# Altium schematic symbol library MCU_ST_STM32H7.SchLib: 191 symbols (part 6 of 8) (continued)
## STM32H745ZGTx (continued)
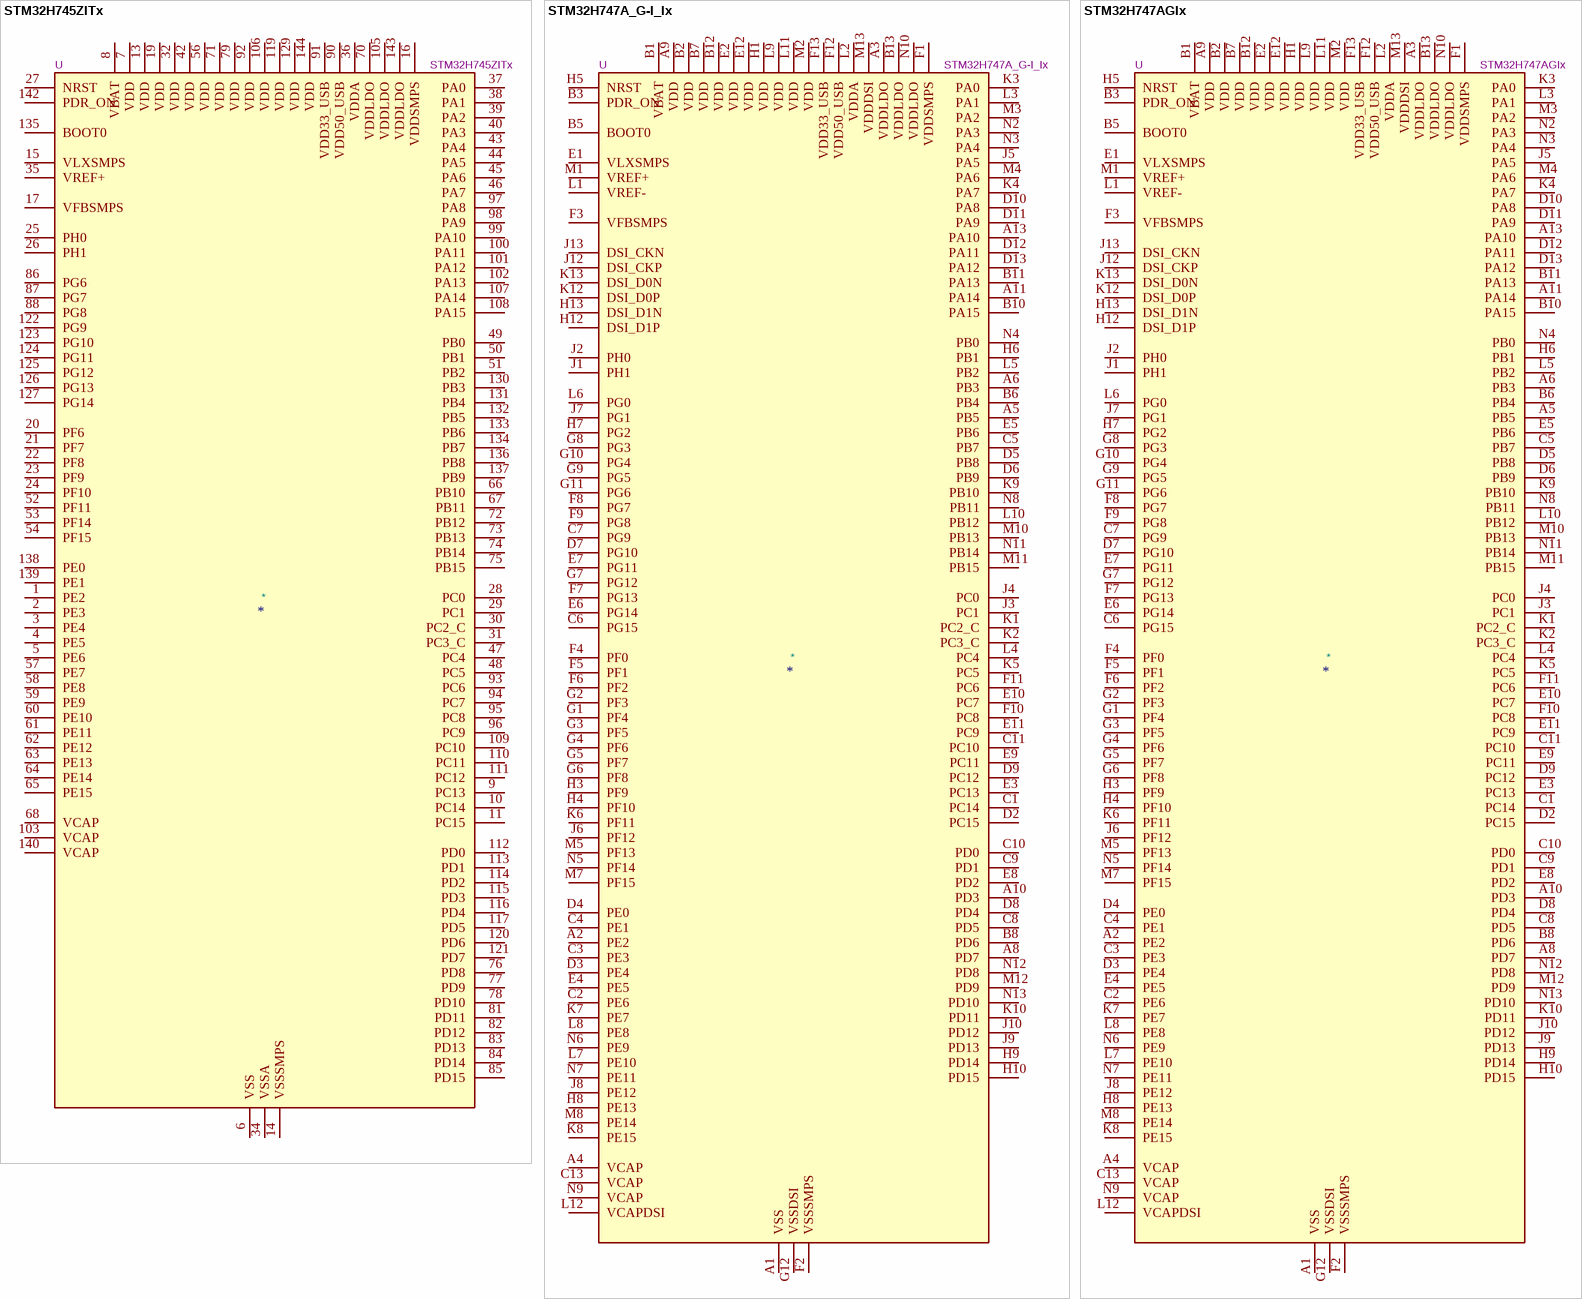
[diagram p53: symbols STM32H745ZITx to STM32H747AGIx]

## STM32H745ZITx
designator *  value STM32H745ZITx  Reference: U
ki_keywords: Arm Cortex-M7 STM32H7 STM32H745/755; ki_description: STMicroelectronics Arm Cortex-M7 MCU, 2048KB flash, 1024KB RAM, 480 MHz, 1.62-3.6V, 99 GPIO, LQFP144; ki_fp_filters: LQFP*20x20mm*P0.5mm*; Footprint: Package_QFP:LQFP-144_20x20mm_P0.5mm; Datasheet: https://www.st.com/resource/en/datasheet/stm32h745zi.pdf
pins: 1 PE2, 2 PE3, 3 PE4, 4 PE5, 5 PE6, 6 VSS, 7 VDD, 8 VBAT, 9 PC13, 10 PC14, 11 PC15, 12 VSS hidden, 13 VDD, 14 VSSSMPS, 15 VLXSMPS, 16 VDDSMPS, 17 VFBSMPS, 18 VSS hidden, 19 VDD, 20 PF6, 21 PF7, 22 PF8, 23 PF9, 24 PF10, 25 PH0, 26 PH1, 27 NRST, 28 PC0, 29 PC1, 30 PC2_C, 31 PC3_C, 32 VDD, 33 VSS hidden, 34 VSSA, 35 VREF+, 36 VDDA, 37 PA0, 38 PA1, 39 PA2, 40 PA3, 41 VSS hidden, 42 VDD, 43 PA4, 44 PA5, 45 PA6, 46 PA7, 47 PC4, 48 PC5, 49 PB0, 50 PB1, 51 PB2, 52 PF11, 53 PF14, 54 PF15, 55 VSS hidden, 56 VDD, 57 PE7, 58 PE8, 59 PE9, 60 PE10, 61 PE11, 62 PE12, 63 PE13, 64 PE14, 65 PE15, 66 PB10, 67 PB11, 68 VCAP, 69 VSS hidden, 70 VDDLDO, 71 VDD, 72 PB12, 73 PB13, 74 PB14, 75 PB15, 76 PD8, 77 PD9, 78 PD10, 79 VDD, 80 VSS hidden, 81 PD11, 82 PD12, 83 PD13, 84 PD14, 85 PD15, 86 PG6, 87 PG7, 88 PG8, 89 VSS hidden, 90 VDD50_USB, 91 VDD33_USB, 92 VDD, 93 PC6, 94 PC7, 95 PC8, 96 PC9, 97 PA8, 98 PA9, 99 PA10, 100 PA11, 101 PA12, 102 PA13, 103 VCAP, 104 VSS hidden, 105 VDDLDO, 106 VDD, 107 PA14, 108 PA15, 109 PC10, 110 PC11, 111 PC12, 112 PD0, 113 PD1, 114 PD2, 115 PD3, 116 PD4, 117 PD5, 118 VSS hidden, 119 VDD, 120 PD6, 121 PD7, 122 PG9, 123 PG10, 124 PG11, 125 PG12, 126 PG13, 127 PG14, 128 VSS hidden, 129 VDD, 130 PB3, 131 PB4, 132 PB5, 133 PB6, 134 PB7, 135 BOOT0, 136 PB8, 137 PB9, 138 PE0, 139 PE1, 140 VCAP, 141 VSS hidden, 142 PDR_ON, 143 VDDLDO, 144 VDD

## STM32H747A_G-I_Ix
designator *  value STM32H747A_G-I_Ix  Reference: U
ki_keywords: Arm Cortex-M7 STM32H7 STM32H747/757; ki_description: STMicroelectronics Arm Cortex-M7 MCU, 1024-2048KB flash, 1024KB RAM, 480 MHz, 1.62-3.6V, 114 GPIO, UFBGA169; ki_fp_filters: *UFBGA*7x7mm*Layout13x13*P0.5mm*; Footprint: Package_BGA:UFBGA-169_7x7mm_Layout13x13_P0.5mm; Datasheet: https://www.st.com/resource/en/datasheet/stm32h747ag.pdf
pins: A1 VSS, A2 PE2, A3 VDDLDO, A4 VCAP, A5 PB5, A6 PB3, A7 VSS hidden, A8 PD7, A9 VDD, A10 PD3, A11 PA14, A12 VSS hidden, A13 PA10, B1 VBAT, B2 VDD, B3 PDR_ON, B4 VSS hidden, B5 BOOT0, B6 PB4, B7 VDD, B8 PD6, B9 VSS hidden, B10 PA15, B11 PA13, B12 VDD, B13 VDDLDO, C1 PC14, C2 PE6, C3 PE3, C4 PE1, C5 PB7, C6 PG15, C7 PG9, C8 PD5, C9 PD1, C10 PD0, C11 PC10, C12 VSS hidden, C13 VCAP, D1 VSS hidden, D2 PC15, D3 PE4, D4 PE0, D5 PB8, D6 PB9, D7 PG10, D8 PD4, D9 PC12, D10 PA8, D11 PA9, D12 PA11, D13 PA12, E1 VLXSMPS, E2 VDD, E3 PC13, E4 PE5, E5 PB6, E6 PG14, E7 PG11, E8 PD2, E9 PC11, E10 PC7, E11 PC9, E12 VDD, E13 VSS hidden, F1 VDDSMPS, F2 VSSSMPS, F3 VFBSMPS, F4 PF0, F5 PF1, F6 PF2, F7 PG13, F8 PG7, F9 PG8, F10 PC8, F11 PC6, F12 VDD50_USB, F13 VDD33_USB, G1 PF4, G2 PF3, G3 PF5, G4 PF6, G5 PF7, G6 PF8, G7 PG12, G8 PG3, G9 PG5, G10 PG4, G11 PG6, G12 VSSDSI, G13 VSSDSI hidden, H1 VDD, H2 VSS hidden, H3 PF9, H4 PF10, H5 NRST, H6 PB1, H7 PG2, H8 PE13, H9 PD14, H10 PD15, H11 VSS hidden, H12 DSI_D1P, H13 DSI_D1N, J1 PH1, J2 PH0, J3 PC1, J4 PC0, J5 PA5, J6 PF12, J7 PG1, J8 PE12, J9 PD13, J10 PD12, J11 VSS hidden, J12 DSI_CKP, J13 DSI_CKN, K1 PC2_C, K2 PC3_C, K3 PA0, K4 PA7, K5 PC5, K6 PF11, K7 PE7, K8 PE15, K9 PB10, K10 PD11, K11 VSS hidden, K12 DSI_D0P, K13 DSI_D0N, L1 VREF-, L2 VDDA, L3 PA1, L4 PC4, L5 PB2, L6 PG0, L7 PE10, L8 PE8, L9 VDD, L10 PB12, L11 VDD, L12 VCAPDSI, L13 VSS hidden, M1 VREF+, M2 VDD, M3 PA2, M4 PA6, M5 PF13, M6 VSS hidden, M7 PF15, M8 PE14, M9 VSS hidden, M10 PB13, M11 PB15, M12 PD9, M13 VDDDSI, N1 VSS hidden, N2 PA3, N3 PA4, N4 PB0, N5 PF14, N6 PE9, N7 PE11, N8 PB11, N9 VCAP, N10 VDDLDO, N11 PB14, N12 PD8, N13 PD10

## STM32H747AGIx
designator *  value STM32H747AGIx  Reference: U
ki_keywords: Arm Cortex-M7 STM32H7 STM32H747/757; ki_description: STMicroelectronics Arm Cortex-M7 MCU, 1024KB flash, 1024KB RAM, 480 MHz, 1.62-3.6V, 114 GPIO, UFBGA169; ki_fp_filters: *UFBGA*7x7mm*Layout13x13*P0.5mm*; Footprint: Package_BGA:UFBGA-169_7x7mm_Layout13x13_P0.5mm; Datasheet: https://www.st.com/resource/en/datasheet/stm32h747ag.pdf
pins: A1 VSS, A2 PE2, A3 VDDLDO, A4 VCAP, A5 PB5, A6 PB3, A7 VSS hidden, A8 PD7, A9 VDD, A10 PD3, A11 PA14, A12 VSS hidden, A13 PA10, B1 VBAT, B2 VDD, B3 PDR_ON, B4 VSS hidden, B5 BOOT0, B6 PB4, B7 VDD, B8 PD6, B9 VSS hidden, B10 PA15, B11 PA13, B12 VDD, B13 VDDLDO, C1 PC14, C2 PE6, C3 PE3, C4 PE1, C5 PB7, C6 PG15, C7 PG9, C8 PD5, C9 PD1, C10 PD0, C11 PC10, C12 VSS hidden, C13 VCAP, D1 VSS hidden, D2 PC15, D3 PE4, D4 PE0, D5 PB8, D6 PB9, D7 PG10, D8 PD4, D9 PC12, D10 PA8, D11 PA9, D12 PA11, D13 PA12, E1 VLXSMPS, E2 VDD, E3 PC13, E4 PE5, E5 PB6, E6 PG14, E7 PG11, E8 PD2, E9 PC11, E10 PC7, E11 PC9, E12 VDD, E13 VSS hidden, F1 VDDSMPS, F2 VSSSMPS, F3 VFBSMPS, F4 PF0, F5 PF1, F6 PF2, F7 PG13, F8 PG7, F9 PG8, F10 PC8, F11 PC6, F12 VDD50_USB, F13 VDD33_USB, G1 PF4, G2 PF3, G3 PF5, G4 PF6, G5 PF7, G6 PF8, G7 PG12, G8 PG3, G9 PG5, G10 PG4, G11 PG6, G12 VSSDSI, G13 VSSDSI hidden, H1 VDD, H2 VSS hidden, H3 PF9, H4 PF10, H5 NRST, H6 PB1, H7 PG2, H8 PE13, H9 PD14, H10 PD15, H11 VSS hidden, H12 DSI_D1P, H13 DSI_D1N, J1 PH1, J2 PH0, J3 PC1, J4 PC0, J5 PA5, J6 PF12, J7 PG1, J8 PE12, J9 PD13, J10 PD12, J11 VSS hidden, J12 DSI_CKP, J13 DSI_CKN, K1 PC2_C, K2 PC3_C, K3 PA0, K4 PA7, K5 PC5, K6 PF11, K7 PE7, K8 PE15, K9 PB10, K10 PD11, K11 VSS hidden, K12 DSI_D0P, K13 DSI_D0N, L1 VREF-, L2 VDDA, L3 PA1, L4 PC4, L5 PB2, L6 PG0, L7 PE10, L8 PE8, L9 VDD, L10 PB12, L11 VDD, L12 VCAPDSI, L13 VSS hidden, M1 VREF+, M2 VDD, M3 PA2, M4 PA6, M5 PF13, M6 VSS hidden, M7 PF15, M8 PE14, M9 VSS hidden, M10 PB13, M11 PB15, M12 PD9, M13 VDDDSI, N1 VSS hidden, N2 PA3, N3 PA4, N4 PB0, N5 PF14, N6 PE9, N7 PE11, N8 PB11, N9 VCAP, N10 VDDLDO, N11 PB14, N12 PD8, N13 PD10

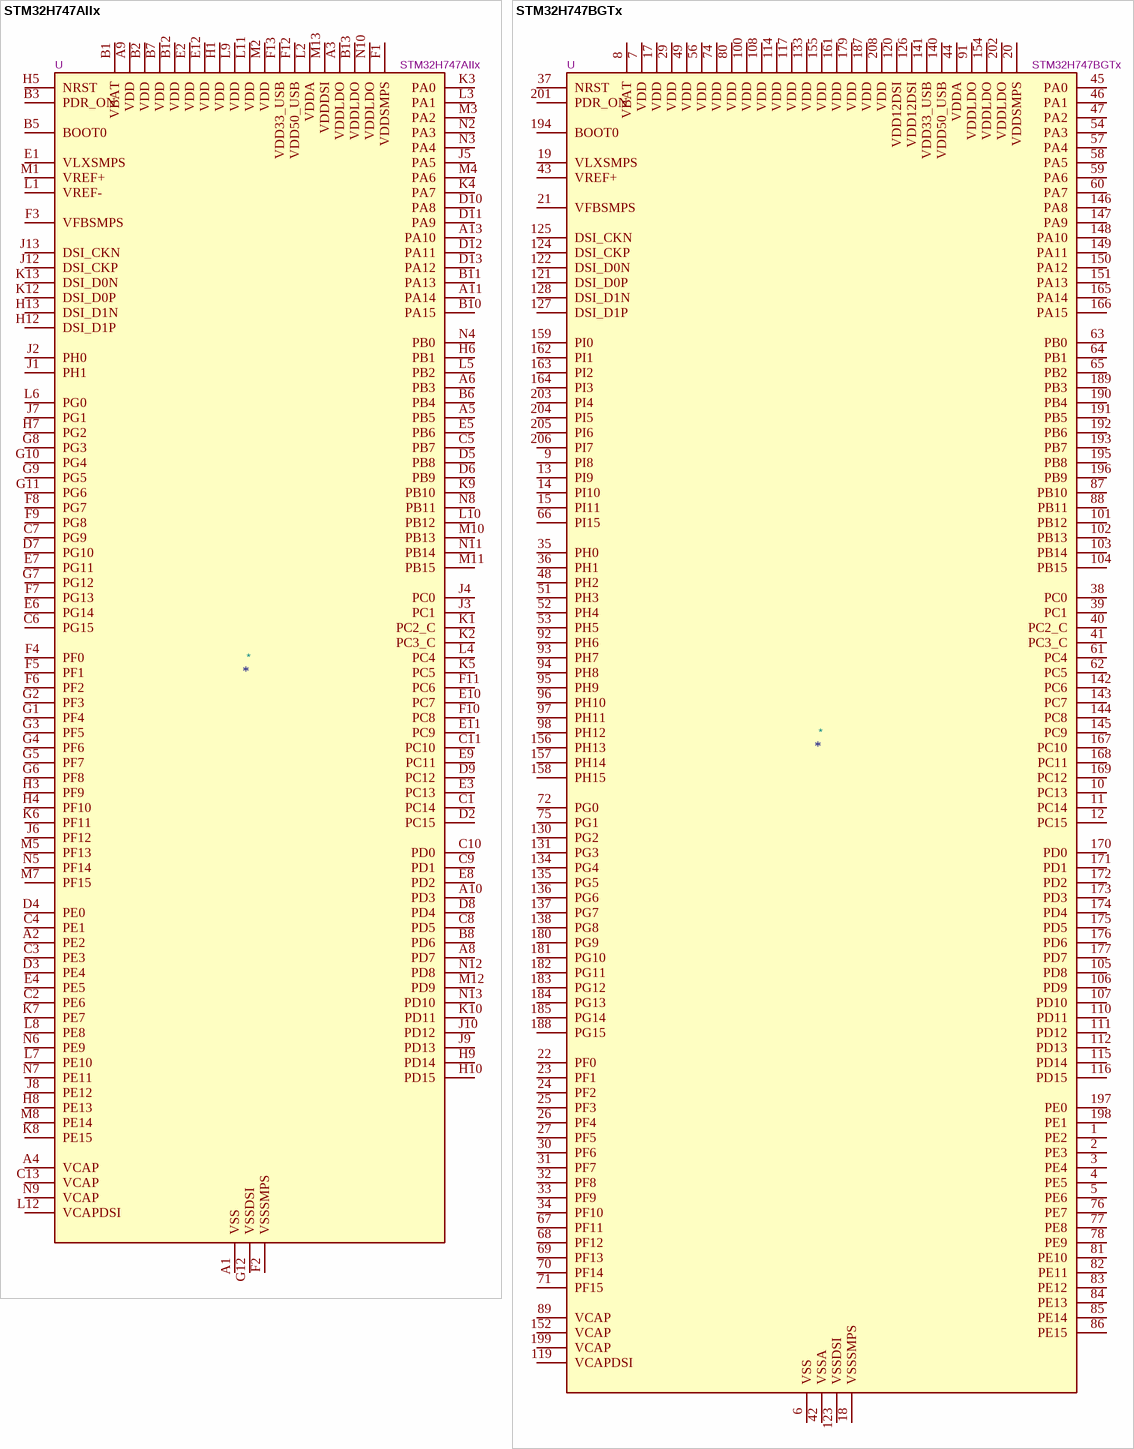
[diagram p54: symbols STM32H747AIIx to STM32H747BGTx]

## STM32H747AIIx
designator *  value STM32H747AIIx  Reference: U
ki_keywords: Arm Cortex-M7 STM32H7 STM32H747/757; ki_description: STMicroelectronics Arm Cortex-M7 MCU, 2048KB flash, 1024KB RAM, 480 MHz, 1.62-3.6V, 114 GPIO, UFBGA169; ki_fp_filters: *UFBGA*7x7mm*Layout13x13*P0.5mm*; Footprint: Package_BGA:UFBGA-169_7x7mm_Layout13x13_P0.5mm; Datasheet: https://www.st.com/resource/en/datasheet/stm32h747ai.pdf
pins: A1 VSS, A2 PE2, A3 VDDLDO, A4 VCAP, A5 PB5, A6 PB3, A7 VSS hidden, A8 PD7, A9 VDD, A10 PD3, A11 PA14, A12 VSS hidden, A13 PA10, B1 VBAT, B2 VDD, B3 PDR_ON, B4 VSS hidden, B5 BOOT0, B6 PB4, B7 VDD, B8 PD6, B9 VSS hidden, B10 PA15, B11 PA13, B12 VDD, B13 VDDLDO, C1 PC14, C2 PE6, C3 PE3, C4 PE1, C5 PB7, C6 PG15, C7 PG9, C8 PD5, C9 PD1, C10 PD0, C11 PC10, C12 VSS hidden, C13 VCAP, D1 VSS hidden, D2 PC15, D3 PE4, D4 PE0, D5 PB8, D6 PB9, D7 PG10, D8 PD4, D9 PC12, D10 PA8, D11 PA9, D12 PA11, D13 PA12, E1 VLXSMPS, E2 VDD, E3 PC13, E4 PE5, E5 PB6, E6 PG14, E7 PG11, E8 PD2, E9 PC11, E10 PC7, E11 PC9, E12 VDD, E13 VSS hidden, F1 VDDSMPS, F2 VSSSMPS, F3 VFBSMPS, F4 PF0, F5 PF1, F6 PF2, F7 PG13, F8 PG7, F9 PG8, F10 PC8, F11 PC6, F12 VDD50_USB, F13 VDD33_USB, G1 PF4, G2 PF3, G3 PF5, G4 PF6, G5 PF7, G6 PF8, G7 PG12, G8 PG3, G9 PG5, G10 PG4, G11 PG6, G12 VSSDSI, G13 VSSDSI hidden, H1 VDD, H2 VSS hidden, H3 PF9, H4 PF10, H5 NRST, H6 PB1, H7 PG2, H8 PE13, H9 PD14, H10 PD15, H11 VSS hidden, H12 DSI_D1P, H13 DSI_D1N, J1 PH1, J2 PH0, J3 PC1, J4 PC0, J5 PA5, J6 PF12, J7 PG1, J8 PE12, J9 PD13, J10 PD12, J11 VSS hidden, J12 DSI_CKP, J13 DSI_CKN, K1 PC2_C, K2 PC3_C, K3 PA0, K4 PA7, K5 PC5, K6 PF11, K7 PE7, K8 PE15, K9 PB10, K10 PD11, K11 VSS hidden, K12 DSI_D0P, K13 DSI_D0N, L1 VREF-, L2 VDDA, L3 PA1, L4 PC4, L5 PB2, L6 PG0, L7 PE10, L8 PE8, L9 VDD, L10 PB12, L11 VDD, L12 VCAPDSI, L13 VSS hidden, M1 VREF+, M2 VDD, M3 PA2, M4 PA6, M5 PF13, M6 VSS hidden, M7 PF15, M8 PE14, M9 VSS hidden, M10 PB13, M11 PB15, M12 PD9, M13 VDDDSI, N1 VSS hidden, N2 PA3, N3 PA4, N4 PB0, N5 PF14, N6 PE9, N7 PE11, N8 PB11, N9 VCAP, N10 VDDLDO, N11 PB14, N12 PD8, N13 PD10

## STM32H747BGTx
designator *  value STM32H747BGTx  Reference: U
ki_keywords: Arm Cortex-M7 STM32H7 STM32H747/757; ki_description: STMicroelectronics Arm Cortex-M7 MCU, 1024KB flash, 1024KB RAM, 480 MHz, 1.62-3.6V, 141 GPIO, LQFP208; ki_fp_filters: LQFP*28x28mm*P0.5mm*; Footprint: Package_QFP:LQFP-208_28x28mm_P0.5mm; Datasheet: https://www.st.com/resource/en/datasheet/stm32h747bg.pdf
pins: 1 PE2, 2 PE3, 3 PE4, 4 PE5, 5 PE6, 6 VSS, 7 VDD, 8 VBAT, 9 PI8, 10 PC13, 11 PC14, 12 PC15, 13 PI9, 14 PI10, 15 PI11, 16 VSS hidden, 17 VDD, 18 VSSSMPS, 19 VLXSMPS, 20 VDDSMPS, 21 VFBSMPS, 22 PF0, 23 PF1, 24 PF2, 25 PF3, 26 PF4, 27 PF5, 28 VSS hidden, 29 VDD, 30 PF6, 31 PF7, 32 PF8, 33 PF9, 34 PF10, 35 PH0, 36 PH1, 37 NRST, 38 PC0, 39 PC1, 40 PC2_C, 41 PC3_C, 42 VSSA, 43 VREF+, 44 VDDA, 45 PA0, 46 PA1, 47 PA2, 48 PH2, 49 VDD, 50 VSS hidden, 51 PH3, 52 PH4, 53 PH5, 54 PA3, 55 VSS hidden, 56 VDD, 57 PA4, 58 PA5, 59 PA6, 60 PA7, 61 PC4, 62 PC5, 63 PB0, 64 PB1, 65 PB2, 66 PI15, 67 PF11, 68 PF12, 69 PF13, 70 PF14, 71 PF15, 72 PG0, 73 VSS hidden, 74 VDD, 75 PG1, 76 PE7, 77 PE8, 78 PE9, 79 VSS hidden, 80 VDD, 81 PE10, 82 PE11, 83 PE12, 84 PE13, 85 PE14, 86 PE15, 87 PB10, 88 PB11, 89 VCAP, 90 VSS hidden, 91 VDDLDO, 92 PH6, 93 PH7, 94 PH8, 95 PH9, 96 PH10, 97 PH11, 98 PH12, 99 VSS hidden, 100 VDD, 101 PB12, 102 PB13, 103 PB14, 104 PB15, 105 PD8, 106 PD9, 107 PD10, 108 VDD, 109 VSS hidden, 110 PD11, 111 PD12, 112 PD13, 113 VSS hidden, 114 VDD, 115 PD14, 116 PD15, 117 VDD, 118 VSS hidden, 119 VCAPDSI, 120 VDD12DSI, 121 DSI_D0P, 122 DSI_D0N, 123 VSSDSI, 124 DSI_CKP, 125 DSI_CKN, 126 VDD12DSI, 127 DSI_D1P, 128 DSI_D1N, 129 VSSDSI hidden, 130 PG2, 131 PG3, 132 VSS hidden, 133 VDD, 134 PG4, 135 PG5, 136 PG6, 137 PG7, 138 PG8, 139 VSS hidden, 140 VDD50_USB, 141 VDD33_USB, 142 PC6, 143 PC7, 144 PC8, 145 PC9, 146 PA8, 147 PA9, 148 PA10, 149 PA11, 150 PA12, 151 PA13, 152 VCAP, 153 VSS hidden, 154 VDDLDO, 155 VDD, 156 PH13, 157 PH14, 158 PH15, 159 PI0, 160 VSS hidden, 161 VDD, 162 PI1, 163 PI2, 164 PI3, 165 PA14, 166 PA15, 167 PC10, 168 PC11, 169 PC12, 170 PD0, 171 PD1, 172 PD2, 173 PD3, 174 PD4, 175 PD5, 176 PD6, 177 PD7, 178 VSS hidden, 179 VDD, 180 PG9, 181 PG10, 182 PG11, 183 PG12, 184 PG13, 185 PG14, 186 VSS hidden, 187 VDD, 188 PG15, 189 PB3, 190 PB4, 191 PB5, 192 PB6, 193 PB7, 194 BOOT0, 195 PB8, 196 PB9, 197 PE0, 198 PE1, 199 VCAP, 200 VSS hidden, 201 PDR_ON, 202 VDDLDO, 203 PI4, 204 PI5, 205 PI6, 206 PI7, 207 VSS hidden, 208 VDD

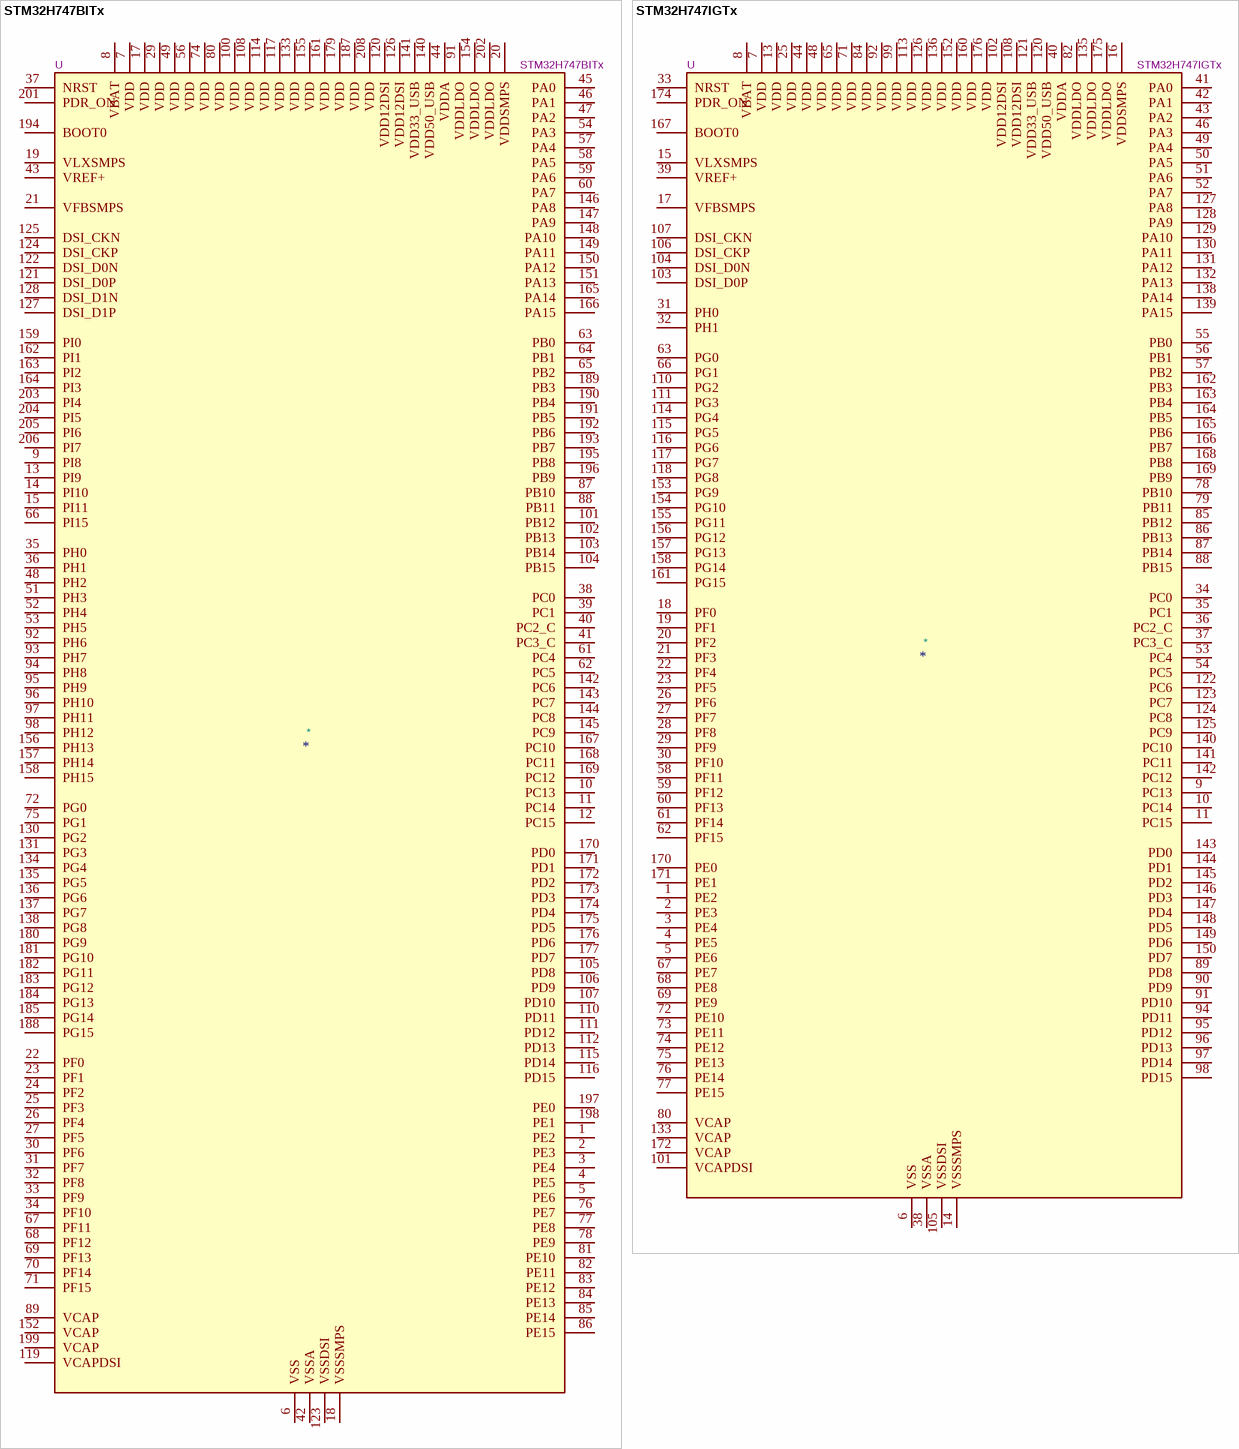
[diagram p55: symbols STM32H747BITx to STM32H747IGTx]

## STM32H747BITx
designator *  value STM32H747BITx  Reference: U
ki_keywords: Arm Cortex-M7 STM32H7 STM32H747/757; ki_description: STMicroelectronics Arm Cortex-M7 MCU, 2048KB flash, 1024KB RAM, 480 MHz, 1.62-3.6V, 141 GPIO, LQFP208; ki_fp_filters: LQFP*28x28mm*P0.5mm*; Footprint: Package_QFP:LQFP-208_28x28mm_P0.5mm; Datasheet: https://www.st.com/resource/en/datasheet/stm32h747bi.pdf
pins: 1 PE2, 2 PE3, 3 PE4, 4 PE5, 5 PE6, 6 VSS, 7 VDD, 8 VBAT, 9 PI8, 10 PC13, 11 PC14, 12 PC15, 13 PI9, 14 PI10, 15 PI11, 16 VSS hidden, 17 VDD, 18 VSSSMPS, 19 VLXSMPS, 20 VDDSMPS, 21 VFBSMPS, 22 PF0, 23 PF1, 24 PF2, 25 PF3, 26 PF4, 27 PF5, 28 VSS hidden, 29 VDD, 30 PF6, 31 PF7, 32 PF8, 33 PF9, 34 PF10, 35 PH0, 36 PH1, 37 NRST, 38 PC0, 39 PC1, 40 PC2_C, 41 PC3_C, 42 VSSA, 43 VREF+, 44 VDDA, 45 PA0, 46 PA1, 47 PA2, 48 PH2, 49 VDD, 50 VSS hidden, 51 PH3, 52 PH4, 53 PH5, 54 PA3, 55 VSS hidden, 56 VDD, 57 PA4, 58 PA5, 59 PA6, 60 PA7, 61 PC4, 62 PC5, 63 PB0, 64 PB1, 65 PB2, 66 PI15, 67 PF11, 68 PF12, 69 PF13, 70 PF14, 71 PF15, 72 PG0, 73 VSS hidden, 74 VDD, 75 PG1, 76 PE7, 77 PE8, 78 PE9, 79 VSS hidden, 80 VDD, 81 PE10, 82 PE11, 83 PE12, 84 PE13, 85 PE14, 86 PE15, 87 PB10, 88 PB11, 89 VCAP, 90 VSS hidden, 91 VDDLDO, 92 PH6, 93 PH7, 94 PH8, 95 PH9, 96 PH10, 97 PH11, 98 PH12, 99 VSS hidden, 100 VDD, 101 PB12, 102 PB13, 103 PB14, 104 PB15, 105 PD8, 106 PD9, 107 PD10, 108 VDD, 109 VSS hidden, 110 PD11, 111 PD12, 112 PD13, 113 VSS hidden, 114 VDD, 115 PD14, 116 PD15, 117 VDD, 118 VSS hidden, 119 VCAPDSI, 120 VDD12DSI, 121 DSI_D0P, 122 DSI_D0N, 123 VSSDSI, 124 DSI_CKP, 125 DSI_CKN, 126 VDD12DSI, 127 DSI_D1P, 128 DSI_D1N, 129 VSSDSI hidden, 130 PG2, 131 PG3, 132 VSS hidden, 133 VDD, 134 PG4, 135 PG5, 136 PG6, 137 PG7, 138 PG8, 139 VSS hidden, 140 VDD50_USB, 141 VDD33_USB, 142 PC6, 143 PC7, 144 PC8, 145 PC9, 146 PA8, 147 PA9, 148 PA10, 149 PA11, 150 PA12, 151 PA13, 152 VCAP, 153 VSS hidden, 154 VDDLDO, 155 VDD, 156 PH13, 157 PH14, 158 PH15, 159 PI0, 160 VSS hidden, 161 VDD, 162 PI1, 163 PI2, 164 PI3, 165 PA14, 166 PA15, 167 PC10, 168 PC11, 169 PC12, 170 PD0, 171 PD1, 172 PD2, 173 PD3, 174 PD4, 175 PD5, 176 PD6, 177 PD7, 178 VSS hidden, 179 VDD, 180 PG9, 181 PG10, 182 PG11, 183 PG12, 184 PG13, 185 PG14, 186 VSS hidden, 187 VDD, 188 PG15, 189 PB3, 190 PB4, 191 PB5, 192 PB6, 193 PB7, 194 BOOT0, 195 PB8, 196 PB9, 197 PE0, 198 PE1, 199 VCAP, 200 VSS hidden, 201 PDR_ON, 202 VDDLDO, 203 PI4, 204 PI5, 205 PI6, 206 PI7, 207 VSS hidden, 208 VDD

## STM32H747IGTx
designator *  value STM32H747IGTx  Reference: U
ki_keywords: Arm Cortex-M7 STM32H7 STM32H747/757; ki_description: STMicroelectronics Arm Cortex-M7 MCU, 1024KB flash, 1024KB RAM, 480 MHz, 1.62-3.6V, 114 GPIO, LQFP176; ki_fp_filters: LQFP*24x24mm*P0.5mm*; Footprint: Package_QFP:LQFP-176_24x24mm_P0.5mm; Datasheet: https://www.st.com/resource/en/datasheet/stm32h747ig.pdf
pins: 1 PE2, 2 PE3, 3 PE4, 4 PE5, 5 PE6, 6 VSS, 7 VDD, 8 VBAT, 9 PC13, 10 PC14, 11 PC15, 12 VSS hidden, 13 VDD, 14 VSSSMPS, 15 VLXSMPS, 16 VDDSMPS, 17 VFBSMPS, 18 PF0, 19 PF1, 20 PF2, 21 PF3, 22 PF4, 23 PF5, 24 VSS hidden, 25 VDD, 26 PF6, 27 PF7, 28 PF8, 29 PF9, 30 PF10, 31 PH0, 32 PH1, 33 NRST, 34 PC0, 35 PC1, 36 PC2_C, 37 PC3_C, 38 VSSA, 39 VREF+, 40 VDDA, 41 PA0, 42 PA1, 43 PA2, 44 VDD, 45 VSS hidden, 46 PA3, 47 VSS hidden, 48 VDD, 49 PA4, 50 PA5, 51 PA6, 52 PA7, 53 PC4, 54 PC5, 55 PB0, 56 PB1, 57 PB2, 58 PF11, 59 PF12, 60 PF13, 61 PF14, 62 PF15, 63 PG0, 64 VSS hidden, 65 VDD, 66 PG1, 67 PE7, 68 PE8, 69 PE9, 70 VSS hidden, 71 VDD, 72 PE10, 73 PE11, 74 PE12, 75 PE13, 76 PE14, 77 PE15, 78 PB10, 79 PB11, 80 VCAP, 81 VSS hidden, 82 VDDLDO, 83 VSS hidden, 84 VDD, 85 PB12, 86 PB13, 87 PB14, 88 PB15, 89 PD8, 90 PD9, 91 PD10, 92 VDD, 93 VSS hidden, 94 PD11, 95 PD12, 96 PD13, 97 PD14, 98 PD15, 99 VDD, 100 VSS hidden, 101 VCAPDSI, 102 VDD12DSI, 103 DSI_D0P, 104 DSI_D0N, 105 VSSDSI, 106 DSI_CKP, 107 DSI_CKN, 108 VDD12DSI, 109 VSSDSI hidden, 110 PG2, 111 PG3, 112 VSS hidden, 113 VDD, 114 PG4, 115 PG5, 116 PG6, 117 PG7, 118 PG8, 119 VSS hidden, 120 VDD50_USB, 121 VDD33_USB, 122 PC6, 123 PC7, 124 PC8, 125 PC9, 126 VDD, 127 PA8, 128 PA9, 129 PA10, 130 PA11, 131 PA12, 132 PA13, 133 VCAP, 134 VSS hidden, 135 VDDLDO, 136 VDD, 137 VSS hidden, 138 PA14, 139 PA15, 140 PC10, 141 PC11, 142 PC12, 143 PD0, 144 PD1, 145 PD2, 146 PD3, 147 PD4, 148 PD5, 149 PD6, 150 PD7, 151 VSS hidden, 152 VDD, 153 PG9, 154 PG10, 155 PG11, 156 PG12, 157 PG13, 158 PG14, 159 VSS hidden, 160 VDD, 161 PG15, 162 PB3, 163 PB4, 164 PB5, 165 PB6, 166 PB7, 167 BOOT0, 168 PB8, 169 PB9, 170 PE0, 171 PE1, 172 VCAP, 173 VSS hidden, 174 PDR_ON, 175 VDDLDO, 176 VDD

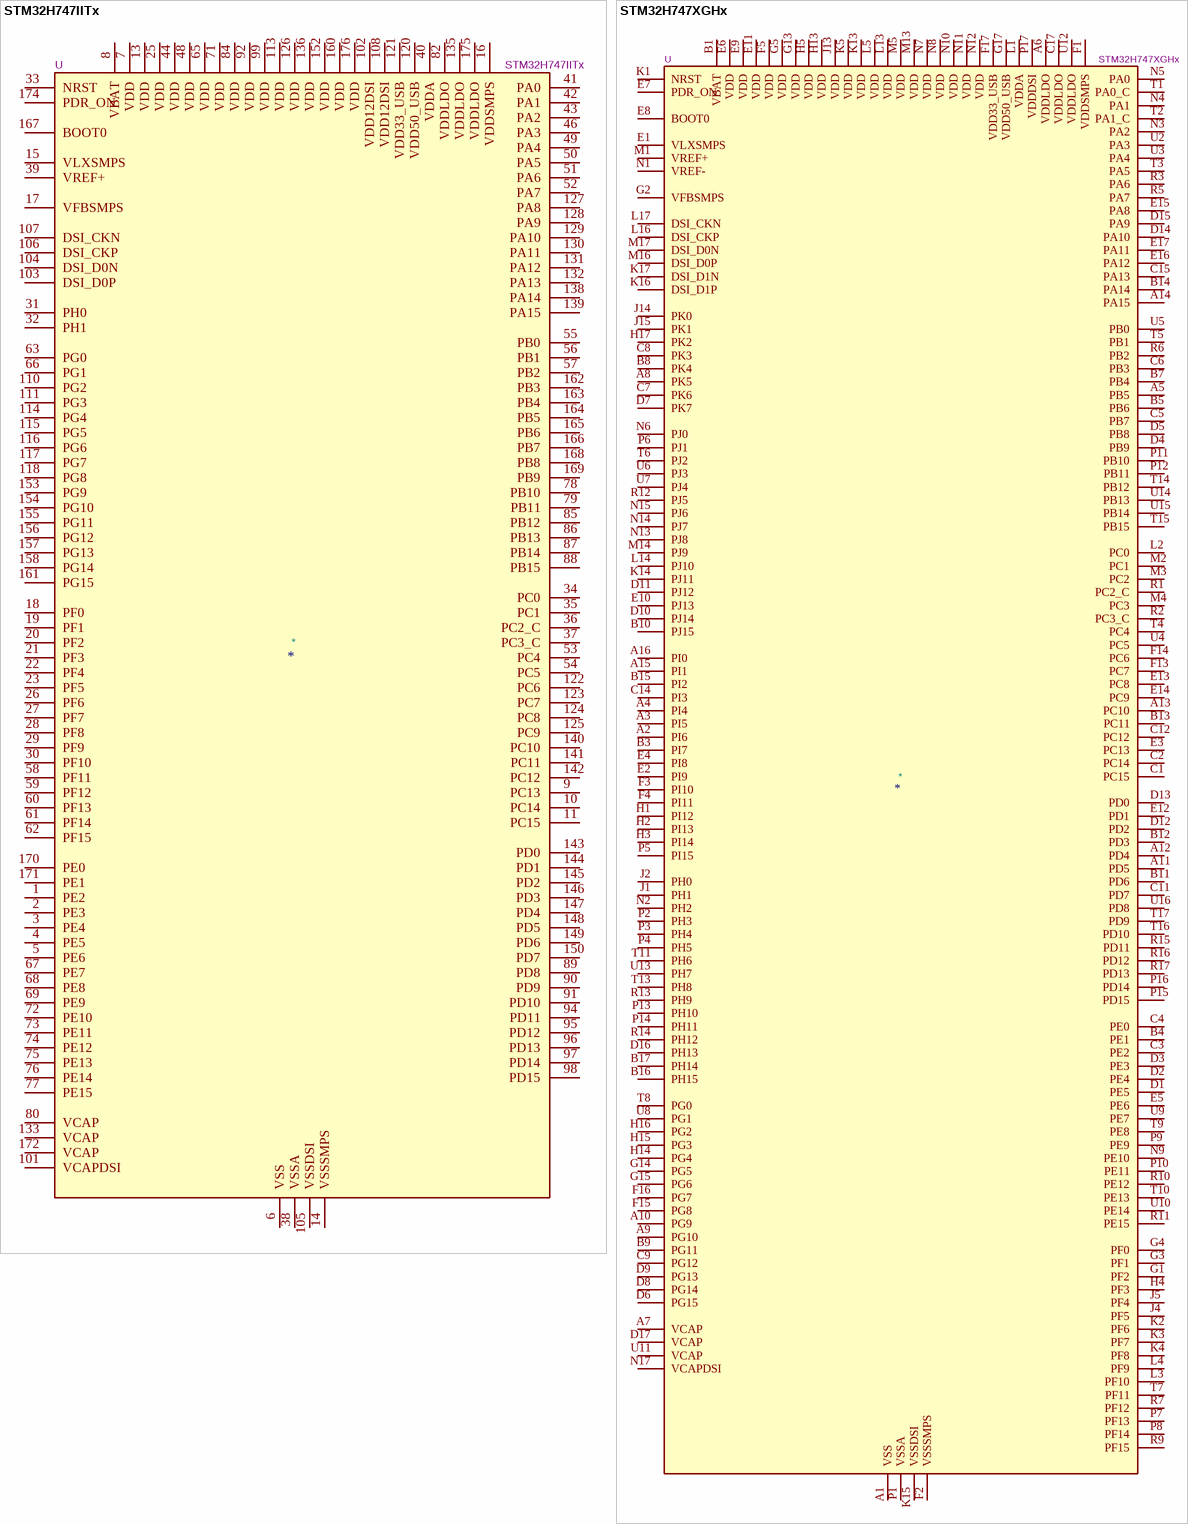
[diagram p56: symbols STM32H747IITx to STM32H747XGHx]

## STM32H747IITx
designator *  value STM32H747IITx  Reference: U
ki_keywords: Arm Cortex-M7 STM32H7 STM32H747/757; ki_description: STMicroelectronics Arm Cortex-M7 MCU, 2048KB flash, 1024KB RAM, 480 MHz, 1.62-3.6V, 114 GPIO, LQFP176; ki_fp_filters: LQFP*24x24mm*P0.5mm*; Footprint: Package_QFP:LQFP-176_24x24mm_P0.5mm; Datasheet: https://www.st.com/resource/en/datasheet/stm32h747ii.pdf
pins: 1 PE2, 2 PE3, 3 PE4, 4 PE5, 5 PE6, 6 VSS, 7 VDD, 8 VBAT, 9 PC13, 10 PC14, 11 PC15, 12 VSS hidden, 13 VDD, 14 VSSSMPS, 15 VLXSMPS, 16 VDDSMPS, 17 VFBSMPS, 18 PF0, 19 PF1, 20 PF2, 21 PF3, 22 PF4, 23 PF5, 24 VSS hidden, 25 VDD, 26 PF6, 27 PF7, 28 PF8, 29 PF9, 30 PF10, 31 PH0, 32 PH1, 33 NRST, 34 PC0, 35 PC1, 36 PC2_C, 37 PC3_C, 38 VSSA, 39 VREF+, 40 VDDA, 41 PA0, 42 PA1, 43 PA2, 44 VDD, 45 VSS hidden, 46 PA3, 47 VSS hidden, 48 VDD, 49 PA4, 50 PA5, 51 PA6, 52 PA7, 53 PC4, 54 PC5, 55 PB0, 56 PB1, 57 PB2, 58 PF11, 59 PF12, 60 PF13, 61 PF14, 62 PF15, 63 PG0, 64 VSS hidden, 65 VDD, 66 PG1, 67 PE7, 68 PE8, 69 PE9, 70 VSS hidden, 71 VDD, 72 PE10, 73 PE11, 74 PE12, 75 PE13, 76 PE14, 77 PE15, 78 PB10, 79 PB11, 80 VCAP, 81 VSS hidden, 82 VDDLDO, 83 VSS hidden, 84 VDD, 85 PB12, 86 PB13, 87 PB14, 88 PB15, 89 PD8, 90 PD9, 91 PD10, 92 VDD, 93 VSS hidden, 94 PD11, 95 PD12, 96 PD13, 97 PD14, 98 PD15, 99 VDD, 100 VSS hidden, 101 VCAPDSI, 102 VDD12DSI, 103 DSI_D0P, 104 DSI_D0N, 105 VSSDSI, 106 DSI_CKP, 107 DSI_CKN, 108 VDD12DSI, 109 VSSDSI hidden, 110 PG2, 111 PG3, 112 VSS hidden, 113 VDD, 114 PG4, 115 PG5, 116 PG6, 117 PG7, 118 PG8, 119 VSS hidden, 120 VDD50_USB, 121 VDD33_USB, 122 PC6, 123 PC7, 124 PC8, 125 PC9, 126 VDD, 127 PA8, 128 PA9, 129 PA10, 130 PA11, 131 PA12, 132 PA13, 133 VCAP, 134 VSS hidden, 135 VDDLDO, 136 VDD, 137 VSS hidden, 138 PA14, 139 PA15, 140 PC10, 141 PC11, 142 PC12, 143 PD0, 144 PD1, 145 PD2, 146 PD3, 147 PD4, 148 PD5, 149 PD6, 150 PD7, 151 VSS hidden, 152 VDD, 153 PG9, 154 PG10, 155 PG11, 156 PG12, 157 PG13, 158 PG14, 159 VSS hidden, 160 VDD, 161 PG15, 162 PB3, 163 PB4, 164 PB5, 165 PB6, 166 PB7, 167 BOOT0, 168 PB8, 169 PB9, 170 PE0, 171 PE1, 172 VCAP, 173 VSS hidden, 174 PDR_ON, 175 VDDLDO, 176 VDD